# Altium footprint library ICs And Semiconductors SMD.PcbLib: 943 footprints (part 59 of 60)
Each footprint in its own frame and in the unit in brackets; x right, y up, seen from the top. Pads: shape width x height; smd on the part's side, far side on the other; paste and mask are expansions set on the pad; w line width, h text height; cw(c..) or ccw(c..) is an arc to the next point about the centre after c.
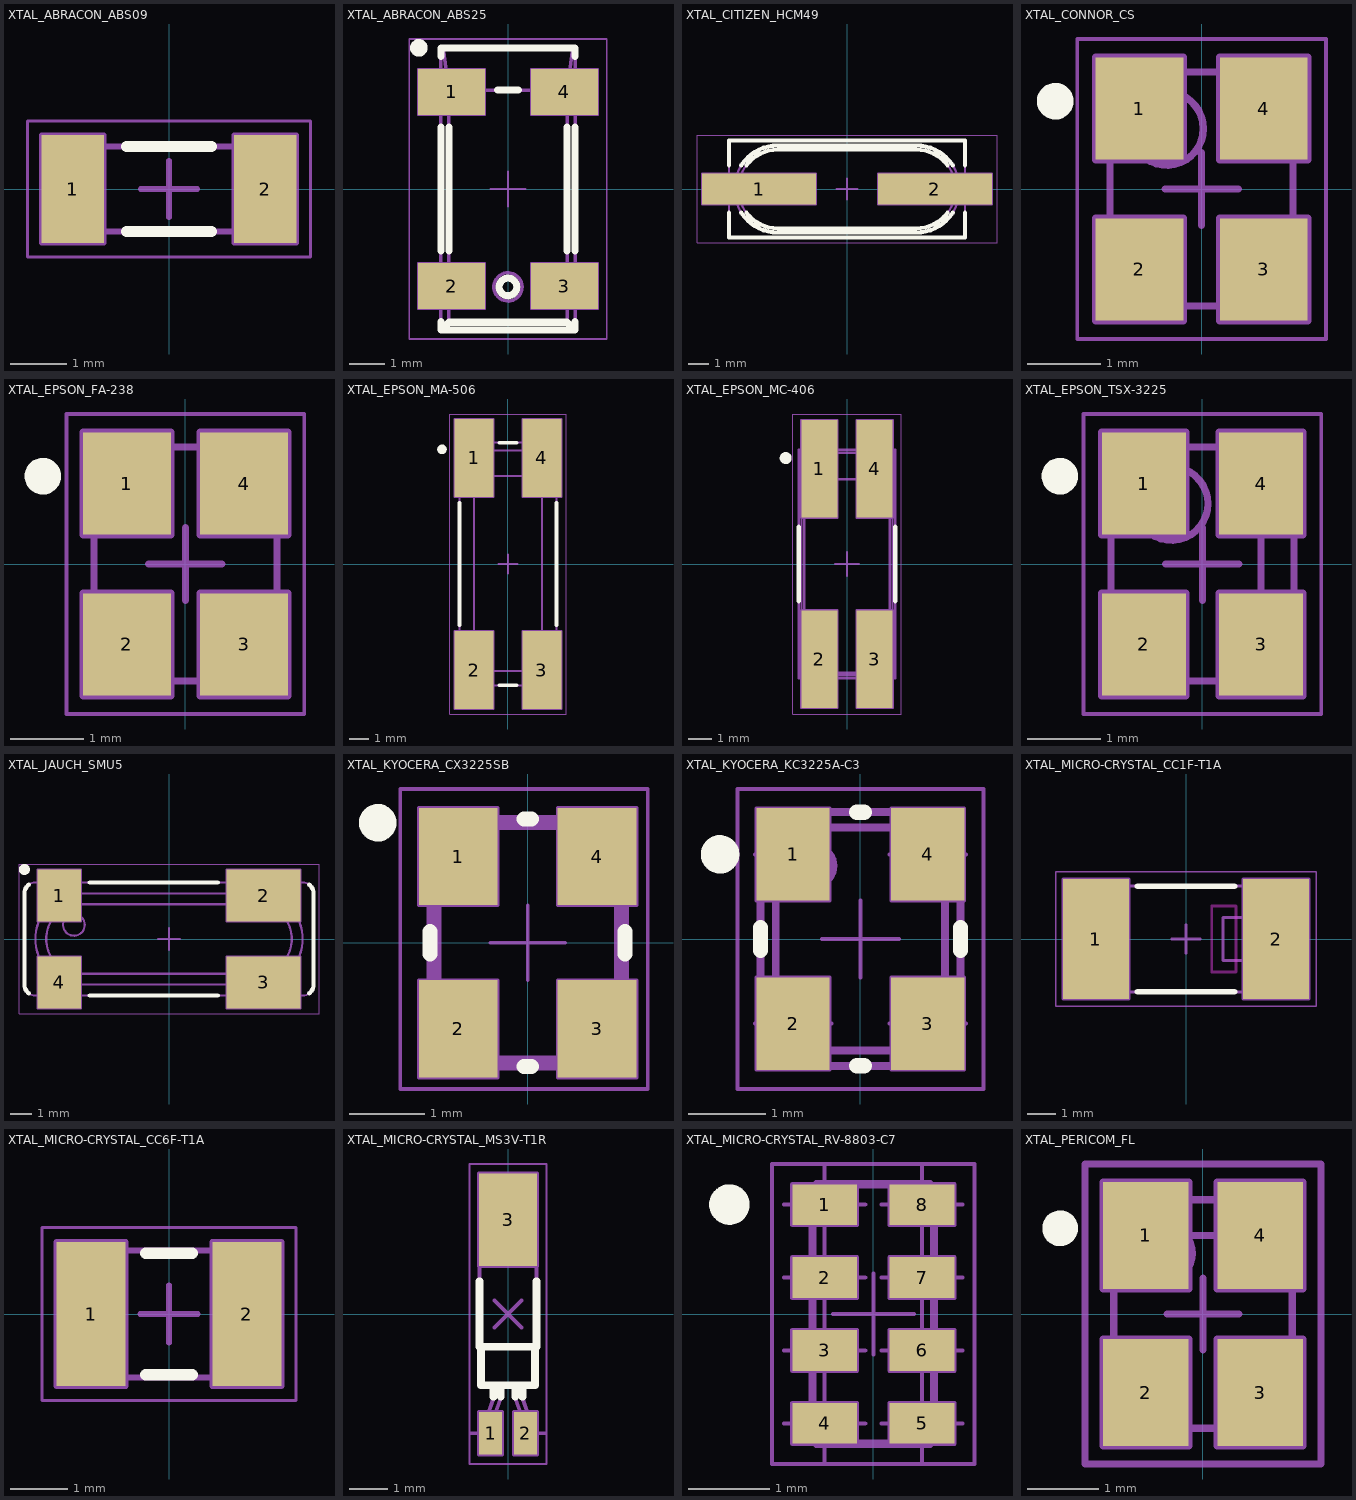
[diagram p58: the footprints below, top view; thin cyan lines are the x and y axes]

## XTAL_ABRACON_ABS09 [mm] "2 Pins, 4.1x1.5mm, SMD Low Profile Crystal, ABS09 Series"
height 0.9
pads (2):
  rect 1.1x1.9 smd: 1(-1.7,0) 2(1.7,0)
Top Overlay:
  lines w0.2: -0.75,-0.75 0.75,-0.75 ; -0.75,0.75 0.75,0.75
Mechanical 8:
  lines w0.1: -2.2,0 -1.7,0 ; -1.7,-0.5 -1.7,0 ; -1.7,0.5 -1.7,0 ; -1.2,0 -1.7,0 ; -0.5,0 0,0 ; 0,-0.5 0,0 ; 0,0.5 0,0 ; 0.5,0 0,0 ; 1.2,0 1.7,0 ; 1.7,-0.5 1.7,0 ; 1.7,0.5 1.7,0 ; 2.2,0 1.7,0 ; -2.25,-0.95 -2.25,0.95 -1.15,0.95 -1.15,-0.95 -2.25,-0.95 ; 1.15,-0.95 1.15,0.95 2.25,0.95 2.25,-0.95 1.15,-0.95
Mechanical 14:
  lines w0.1: -2.05,-0.6 cw(c-2.05,-0.75) -1.9,-0.75 1.9,-0.75 cw(c2.05,-0.75) 2.05,-0.6 2.05,0.6 cw(c2.05,0.75) 1.9,0.75 -1.9,0.75 cw(c-2.05,0.75) -2.05,0.6 -2.05,-0.6
Mechanical 15:
  lines w0.05: -2.5,-1.2 2.5,-1.2 2.5,1.2 -2.5,1.2 -2.5,-1.2
3D body "XTAL_ABRACON_ABS09.stp": height 0.9, standoff 0, extent -2.05,-0.75 2.05,0.75

## XTAL_ABRACON_ABS25 [mm] "4 Pins, 8mm L X 3.8mm W X 2.7mm H, SMD Crystal, ABS25 Serie"
height 2.7
pads (4):
  rect 1.9x1.3 smd: 1(-1.6,2.75) 2(-1.6,-2.75) 3(1.6,-2.75) 4(1.6,2.75)
Top Overlay:
  circle w0.25: c-2.525,4 r0.125
  circle w0.2: c0,-2.775 r0.25
  lines w0.2: -1.9,-3.75 -1.9,-4 ; -1.9,-1.75 -1.9,1.75 ; -1.9,3.75 -1.9,4 1.9,4 1.9,3.75 ; -1.675,-1.75 -1.675,1.75 ; -0.3,2.8 0.3,2.8 ; 1.675,-1.75 1.675,1.75 ; 1.9,-3.75 1.9,-4 ; 1.9,-1.75 1.9,1.75 ; -1.9,-4 1.9,-4 ; -1.9,-4 -1.675,-3.775 1.675,-3.775 1.9,-4
Mechanical 8:
  lines w0.05: -2.1,-2.75 -1.6,-2.75 ; -2.1,2.75 -1.6,2.75 ; -1.6,-3.25 -1.6,-2.75 ; -1.6,-2.25 -1.6,-2.75 ; -1.6,2.25 -1.6,2.75 ; -1.6,3.25 -1.6,2.75 ; -1.1,-2.75 -1.6,-2.75 ; -1.1,2.75 -1.6,2.75 ; -0.5,0 0,0 ; 0,-0.5 0,0 ; 0,0.5 0,0 ; 0.5,0 0,0 ; 1.1,-2.75 1.6,-2.75 ; 1.1,2.75 1.6,2.75 ; 1.6,-3.25 1.6,-2.75 ; 1.6,-2.25 1.6,-2.75 ; 1.6,2.25 1.6,2.75 ; 1.6,3.25 1.6,2.75 ; 2.1,-2.75 1.6,-2.75 ; 2.1,2.75 1.6,2.75 ; -2.55,-3.4 -2.55,-2.1 -0.65,-2.1 -0.65,-3.4 -2.55,-3.4 ; -2.55,2.1 -2.55,3.4 -0.65,3.4 -0.65,2.1 -2.55,2.1 ; 0.65,-3.4 0.65,-2.1 2.55,-2.1 2.55,-3.4 0.65,-3.4 ; 0.65,2.1 0.65,3.4 2.55,3.4 2.55,2.1 0.65,2.1
Mechanical 14:
  circle w0.1: c0,-2.775 r0.4
  lines w0.1: -1.9,-3 -2,-3 -2,-2.5 -1.9,-2.5 ; -1.9,2.5 -2,2.5 -2,3 -1.9,3 ; -1.836,4 -1.675,2.8 ; 1.836,4 1.675,2.8 ; 1.9,-3 2,-3 2,-2.5 1.9,-2.5 ; 1.9,2.5 2,2.5 2,3 1.9,3 ; -1.9,-4 1.9,-4 ; -1.9,-4 -1.9,4 1.9,4 1.9,-4 ; -1.9,-4 -1.675,-3.775 ; -1.675,-3.775 1.675,-3.775 ; -1.675,-3.775 -1.675,2.8 ; -1.675,2.8 1.675,2.8 ; 1.675,-3.775 1.9,-4 ; 1.675,-3.775 1.675,2.8
Mechanical 15:
  lines w0.05: -2.8,-4.25 -2.8,4.25 2.8,4.25 2.8,-4.25 -2.8,-4.25
3D body "XTAL_ABRACON_ABS25.stp": height 2.7, standoff 0, extent -2,-4 2,4

## XTAL_CITIZEN_HCM49 [mm] "CITIZEN HCM49 Case, SMD Cristal, Body 11.4 x 4.7mm"
height 4.3
pads (2):
  rect 5.5x1.5 smd: 1(-4.25,0) 2(4.25,0)
Top Overlay:
  lines w0.2: -5.7,-1.15 -5.7,-2.35 5.7,-2.35 5.7,-1.15 ; -5.7,1.15 -5.7,2.35 5.7,2.35 5.7,1.15 ; -5.108,-1.15 ccw(c-3.345,0) -3.345,-2.105 3.345,-2.105 ccw(c3.345,0) 5.108,-1.15 ; -5.108,1.15 cw(c-3.345,0) -3.345,2.105 3.345,2.105 cw(c3.345,0) 5.108,1.15 ; -4.864,-1.15 ccw(c-3.345,0) -3.345,-1.905 3.345,-1.905 ccw(c3.345,0) 4.864,-1.15 ; -4.864,1.15 cw(c-3.345,0) -3.345,1.905 3.345,1.905 cw(c3.345,0) 4.864,1.15
Mechanical 8:
  lines w0.1: -4.75,0 -4.25,0 ; -4.25,-0.5 -4.25,0 ; -4.25,0.5 -4.25,0 ; -3.75,0 -4.25,0 ; -0.5,0 0,0 ; 0,-0.5 0,0 ; 0,0.5 0,0 ; 0.5,0 0,0 ; 3.75,0 4.25,0 ; 4.25,-0.5 4.25,0 ; 4.25,0.5 4.25,0 ; 4.75,0 4.25,0 ; -7,-0.75 -1.5,-0.75 -1.5,0.75 -7,0.75 -7,-0.75 ; 1.5,-0.75 7,-0.75 7,0.75 1.5,0.75 1.5,-0.75
Mechanical 14:
  lines w0.1: -5.7,-2.35 5.7,-2.35 5.7,2.35 -5.7,2.35 -5.7,-2.35 ; -3.345,-2.105 cw(c-3.345,0) -3.345,2.105 3.345,2.105 cw(c3.345,0) 3.345,-2.105 -3.345,-2.105 ; -3.345,-1.905 cw(c-3.345,0) -3.345,1.905 3.345,1.905 cw(c3.345,0) 3.345,-1.905 -3.345,-1.905
Mechanical 15:
  lines w0.05: -7.25,-2.6 -7.25,2.6 7.25,2.6 7.25,-2.6 -7.25,-2.6
3D body "XTAL_CITIZEN_HCM49.stp": height 4.3, standoff 0, extent -6.002,-2.35 6.002,2.35

## XTAL_CONNOR_CS [mm] "4 Pins, 2.5x3.2mm, SMD Sealing Crystal, CS Serie"
height 0.8
pads (4):
  rect 1.2x1.4 smd: 1(-0.85,1.1) 2(-0.85,-1.1) 3(0.85,-1.1) 4(0.85,1.1)
Top Overlay:
  circle w0.25: c-2,1.2 r0.125
Mechanical 8:
  lines w0.1: -1.35,-1.1 -0.85,-1.1 ; -1.35,1.1 -0.85,1.1 ; -0.85,-1.6 -0.85,-1.1 ; -0.85,-0.6 -0.85,-1.1 ; -0.85,0.6 -0.85,1.1 ; -0.85,1.6 -0.85,1.1 ; -0.5,0 0,0 ; -0.35,-1.1 -0.85,-1.1 ; -0.35,1.1 -0.85,1.1 ; 0,-0.5 0,0 ; 0,0.5 0,0 ; 0.35,-1.1 0.85,-1.1 ; 0.35,1.1 0.85,1.1 ; 0.5,0 0,0 ; 0.85,-1.6 0.85,-1.1 ; 0.85,-0.6 0.85,-1.1 ; 0.85,0.6 0.85,1.1 ; 0.85,1.6 0.85,1.1 ; 1.35,-1.1 0.85,-1.1 ; 1.35,1.1 0.85,1.1 ; -1.45,-1.8 -0.25,-1.8 -0.25,-0.4 -1.45,-0.4 -1.45,-1.8 ; -1.45,0.4 -0.25,0.4 -0.25,1.8 -1.45,1.8 -1.45,0.4 ; 0.25,-1.8 1.45,-1.8 1.45,-0.4 0.25,-0.4 0.25,-1.8 ; 0.25,0.4 1.45,0.4 1.45,1.8 0.25,1.8 0.25,0.4
Mechanical 14:
  circle w0.1: c-0.475,0.825 r0.5
  lines w0.1: -1.25,-1.5 cw(c-1.25,-1.6) -1.15,-1.6 1.15,-1.6 cw(c1.25,-1.6) 1.25,-1.5 1.25,1.5 cw(c1.25,1.6) 1.15,1.6 -1.15,1.6 cw(c-1.25,1.6) -1.25,1.5 -1.25,-1.5
Mechanical 15:
  lines w0.05: -1.7,-2.05 1.7,-2.05 1.7,2.05 -1.7,2.05 -1.7,-2.05
3D body "XTAL_CONNOR_CS.stp": height 0.8, standoff 0, extent -1.25,-1.6 1.25,1.6

## XTAL_EPSON_FA-238 [mm] "Crystal FA-238 Series, Corner Concave; 4 pin, 2.50mm L X 3.2mm W X 0.7mm H"
height 0.7
pads (4):
  rect 1.2x1.4 smd: 1(-0.8,1.1) 2(-0.8,-1.1) 3(0.8,-1.1) 4(0.8,1.1)
Top Overlay:
  circle w0.25: c-1.95,1.2 r0.125
Mechanical 8:
  lines w0.1: -1.3,-1.1 -0.8,-1.1 ; -1.3,1.1 -0.8,1.1 ; -0.8,-1.6 -0.8,-1.1 ; -0.8,-0.6 -0.8,-1.1 ; -0.8,0.6 -0.8,1.1 ; -0.8,1.6 -0.8,1.1 ; -0.5,0 0,0 ; -0.3,-1.1 -0.8,-1.1 ; -0.3,1.1 -0.8,1.1 ; 0,-0.5 0,0 ; 0,0.5 0,0 ; 0.3,-1.1 0.8,-1.1 ; 0.3,1.1 0.8,1.1 ; 0.5,0 0,0 ; 0.8,-1.6 0.8,-1.1 ; 0.8,-0.6 0.8,-1.1 ; 0.8,0.6 0.8,1.1 ; 0.8,1.6 0.8,1.1 ; 1.3,-1.1 0.8,-1.1 ; 1.3,1.1 0.8,1.1 ; -1.4,-1.8 -0.2,-1.8 -0.2,-0.4 -1.4,-0.4 -1.4,-1.8 ; -1.4,0.4 -0.2,0.4 -0.2,1.8 -1.4,1.8 -1.4,0.4 ; 0.2,-1.8 1.4,-1.8 1.4,-0.4 0.2,-0.4 0.2,-1.8 ; 0.2,0.4 1.4,0.4 1.4,1.8 0.2,1.8 0.2,0.4
Mechanical 14:
  lines w0.1: -1.25,-1.5 cw(c-1.25,-1.6) -1.15,-1.6 1.15,-1.6 cw(c1.25,-1.6) 1.25,-1.5 1.25,1.5 cw(c1.25,1.6) 1.15,1.6 -1.15,1.6 cw(c-1.25,1.6) -1.25,1.5 -1.25,-1.5
Mechanical 15:
  lines w0.05: -1.625,-2.05 1.625,-2.05 1.625,2.05 -1.625,2.05 -1.625,-2.05
3D body "XTAL_EPSON_FA-238.stp": height 0.7, standoff 0, extent -1.25,-1.6 1.25,1.6

## XTAL_EPSON_MA-506 [mm] "EPSON Crystal; 12.7mm L X 5.08mm W X 4.6mm H"
height 4.6
pads (4):
  rect 2.05x4.1 smd: 1(-1.775,5.55) 2(-1.775,-5.55) 3(1.775,-5.55) 4(1.775,5.55)
Top Overlay:
  circle w0.25: c-3.455,6 r0.125
  lines w0.2: -2.54,-3.2 -2.54,3.2 ; -0.45,-6.35 0.45,-6.35 ; -0.45,6.35 0.45,6.35 ; 2.54,-3.2 2.54,3.2
Mechanical 8:
  lines w0.1: -2.275,-5.55 -1.775,-5.55 ; -2.275,5.55 -1.775,5.55 ; -1.775,-6.05 -1.775,-5.55 ; -1.775,-5.05 -1.775,-5.55 ; -1.775,5.05 -1.775,5.55 ; -1.775,6.05 -1.775,5.55 ; -1.275,-5.55 -1.775,-5.55 ; -1.275,5.55 -1.775,5.55 ; -0.5,0 0,0 ; 0,-0.5 0,0 ; 0,0.5 0,0 ; 0.5,0 0,0 ; 1.275,-5.55 1.775,-5.55 ; 1.275,5.55 1.775,5.55 ; 1.775,-6.05 1.775,-5.55 ; 1.775,-5.05 1.775,-5.55 ; 1.775,5.05 1.775,5.55 ; 1.775,6.05 1.775,5.55 ; 2.275,-5.55 1.775,-5.55 ; 2.275,5.55 1.775,5.55 ; -2.8,-7.6 -2.8,-3.5 -0.75,-3.5 -0.75,-7.6 -2.8,-7.6 ; -2.8,3.5 -2.8,7.6 -0.75,7.6 -0.75,3.5 -2.8,3.5 ; 0.75,-7.6 0.75,-3.5 2.8,-3.5 2.8,-7.6 0.75,-7.6 ; 0.75,3.5 0.75,7.6 2.8,7.6 2.8,3.5 0.75,3.5
Mechanical 14:
  lines w0.1: -2.54,-6.35 -1.79,-5.6 ; -2.54,-6.35 -2.54,6.35 ; -2.54,-6.35 2.54,-6.35 ; -2.54,6.35 -2.14,5.95 ; -2.54,6.35 2.54,6.35 ; -2.14,5.95 2.14,5.95 ; -2.14,5.95 -1.79,4.6 ; -1.79,-5.6 1.79,-5.6 ; -1.79,-5.6 -1.79,4.6 ; -1.79,4.6 1.79,4.6 ; 1.79,-5.6 2.54,-6.35 ; 1.79,-5.6 1.79,4.6 ; 1.79,4.6 2.14,5.95 ; 2.14,5.95 2.54,6.35 ; 2.54,-6.35 2.54,6.35
Mechanical 15:
  lines w0.05: -3.05,-7.85 -3.05,7.85 3.05,7.85 3.05,-7.85 -3.05,-7.85
3D body "XTAL_EPSON_MA-506.stp": height 4.6, standoff 0, extent -2.54,-6.73 2.54,6.73

## XTAL_EPSON_MC-406 [mm] "EPSON Crystal; 10.41mm L X 4.06mm W X 3.6mm H"
height 3.6
pads (4):
  rect 1.52x4.1 smd: 1(-1.16,4) 2(-1.16,-4) 3(1.16,-4) 4(1.16,4)
Top Overlay:
  circle w0.25: c-2.575,4.45 r0.125
  lines w0.2: -2.03,-1.55 -2.03,1.55 ; 2.03,-1.55 2.03,1.55
Mechanical 8:
  lines w0.1: -1.66,-4 -1.16,-4 ; -1.66,4 -1.16,4 ; -1.16,-4.5 -1.16,-4 ; -1.16,-3.5 -1.16,-4 ; -1.16,3.5 -1.16,4 ; -1.16,4.5 -1.16,4 ; -0.66,-4 -1.16,-4 ; -0.66,4 -1.16,4 ; -0.5,0 0,0 ; 0,-0.5 0,0 ; 0,0.5 0,0 ; 0.5,0 0,0 ; 0.66,-4 1.16,-4 ; 0.66,4 1.16,4 ; 1.16,-4.5 1.16,-4 ; 1.16,-3.5 1.16,-4 ; 1.16,3.5 1.16,4 ; 1.16,4.5 1.16,4 ; 1.66,-4 1.16,-4 ; 1.66,4 1.16,4 ; -1.92,-6.05 -1.92,-1.95 -0.4,-1.95 -0.4,-6.05 -1.92,-6.05 ; -1.92,1.95 -1.92,6.05 -0.4,6.05 -0.4,1.95 -1.92,1.95 ; 0.4,-6.05 0.4,-1.95 1.92,-1.95 1.92,-6.05 0.4,-6.05 ; 0.4,1.95 0.4,6.05 1.92,6.05 1.92,1.95 0.4,1.95
Mechanical 14:
  circle w0.1: c-1.025,2.575 r0.5
  lines w0.1: -1.4,-4.8 -1.4,-5.405 -0.89,-5.405 -0.89,-4.8 ; -0.89,4.8 -0.89,5.39 -1.4,5.39 -1.4,4.8 ; 0.89,-4.8 0.89,-5.405 1.4,-5.405 1.4,-4.8 ; 0.89,4.8 0.89,5.405 1.4,5.405 1.4,4.8 ; -2.03,-4.8 -1.79,-4.56 ; -2.03,-4.8 -2.03,4.8 ; -2.03,-4.8 2.03,-4.8 ; -2.03,4.8 -1.91,4.68 ; -2.03,4.8 2.03,4.8 2.03,-4.8 ; -2.03,4.8 -1.4,4.8 ; -2.03,4.8 -1.4,4.8 ; -1.91,4.68 1.91,4.68 ; -1.91,4.68 -1.91,-4.68 1.91,-4.68 1.91,4.68 ; -1.91,4.68 -1.79,3.56 ; -1.79,-4.56 -1.79,3.56 ; -1.79,-4.56 1.79,-4.56 ; -1.79,3.56 1.79,3.56 ; 1.79,-4.56 2.03,-4.8 ; 1.79,-4.56 1.79,3.56 ; 1.79,3.56 1.91,4.68
Mechanical 15:
  lines w0.05: -2.28,-6.3 2.28,-6.3 2.28,6.3 -2.28,6.3 -2.28,-6.3
3D body "XTAL_EPSON_MC-406.stp": height 3.6, standoff 0, extent -2.03,-5.405 2.03,5.405

## XTAL_EPSON_TSX-3225 [mm] "Crystal TSX-3225 Serie, Corner Concave; 4 pin, 2.50mm L X 3.2mm W X 0.6mm H"
height 0.6
pads (4):
  rect 1.15x1.4 smd: 1(-0.8,1.1) 2(-0.8,-1.1) 3(0.8,-1.1) 4(0.8,1.1)
Top Overlay:
  circle w0.25: c-1.95,1.2 r0.125
Mechanical 8:
  lines w0.1: -1.3,-1.1 -0.8,-1.1 ; -1.3,1.1 -0.8,1.1 ; -0.8,-1.6 -0.8,-1.1 ; -0.8,-0.6 -0.8,-1.1 ; -0.8,0.6 -0.8,1.1 ; -0.8,1.6 -0.8,1.1 ; -0.75,0.93 -0.75,1.43 ; -0.5,0 0,0 ; -0.3,-1.1 -0.8,-1.1 ; -0.3,1.1 -0.8,1.1 ; 0,-0.5 0,0 ; 0,0.5 0,0 ; 0.3,-1.1 0.8,-1.1 ; 0.3,1.1 0.8,1.1 ; 0.5,0 0,0 ; 0.8,-1.6 0.8,-1.1 ; 0.8,-0.6 0.8,-1.1 ; 0.8,0.6 0.8,1.1 ; 0.8,1.6 0.8,1.1 ; 1.3,-1.1 0.8,-1.1 ; 1.3,1.1 0.8,1.1 ; 0.8,-1.1 0.8,1.1 ; -1.375,-1.8 -1.375,-0.4 -0.225,-0.4 -0.225,-1.8 -1.375,-1.8 ; -1.375,0.4 -1.375,1.8 -0.225,1.8 -0.225,0.4 -1.375,0.4 ; 0.225,-1.8 0.225,-0.4 1.375,-0.4 1.375,-1.8 0.225,-1.8 ; 0.225,0.4 0.225,1.8 1.375,1.8 1.375,0.4 0.225,0.4
Mechanical 14:
  circle w0.1: c-0.425,0.825 r0.5
  lines w0.1: -1.25,-1.5 cw(c-1.25,-1.6) -1.15,-1.6 1.15,-1.6 cw(c1.25,-1.6) 1.25,-1.5 1.25,1.5 cw(c1.25,1.6) 1.15,1.6 -1.15,1.6 cw(c-1.25,1.6) -1.25,1.5 -1.25,-1.5
Mechanical 15:
  lines w0.05: -1.625,-2.05 -1.625,2.05 1.625,2.05 1.625,-2.05 -1.625,-2.05
3D body "XTAL_EPSON_TSX-3225.stp": height 0.6, standoff 0, extent -1.25,-1.6 1.25,1.6

## XTAL_JAUCH_SMU5 [mm] "JAUCH SMU5 Crystal; 13.1mm L X 5mm W X 5.1mm H"
height 5.1
pads (4):
  rect 2x2.4 smd: 1(-5.05,2) 4(-5.05,-2)
  rect 3.4x2.4 smd: 2(4.35,2) 3(4.35,-2)
Top Overlay:
  circle w0.25: c-6.65,3.2 r0.125
  lines w0.2: -6.45,-2.5 cw(c-6.15,-2.1) -6.65,-2.1 -6.65,2.1 cw(c-6.15,2.1) -6.45,2.5 ; -3.65,-2.6 2.25,-2.6 ; -3.65,2.6 2.25,2.6 ; 6.45,-2.5 ccw(c6.15,-2.1) 6.65,-2.1 6.65,2.1 ccw(c6.15,2.1) 6.45,2.5
Mechanical 8:
  lines w0.1: -5.55,-2 -5.05,-2 ; -5.55,2 -5.05,2 ; -5.05,-2.5 -5.05,-2 ; -5.05,-1.5 -5.05,-2 ; -5.05,1.5 -5.05,2 ; -5.05,2.5 -5.05,2 ; -4.55,-2 -5.05,-2 ; -4.55,2 -5.05,2 ; -0.5,0 0,0 ; 0,-0.5 0,0 ; 0,0.5 0,0 ; 0.5,0 0,0 ; 3.85,-2 4.35,-2 ; 3.85,2 4.35,2 ; 4.35,-2.5 4.35,-2 ; 4.35,-1.5 4.35,-2 ; 4.35,1.5 4.35,2 ; 4.35,2.5 4.35,2 ; 4.85,-2 4.35,-2 ; 4.85,2 4.35,2 ; -6.05,-3.2 -6.05,-0.8 -4.05,-0.8 -4.05,-3.2 -6.05,-3.2 ; -6.05,0.8 -6.05,3.2 -4.05,3.2 -4.05,0.8 -6.05,0.8 ; 2.65,-3.2 6.05,-3.2 6.05,-0.8 2.65,-0.8 2.65,-3.2 ; 2.65,0.8 6.05,0.8 6.05,3.2 2.65,3.2 2.65,0.8
Mechanical 14:
  circle w0.1: c-4.375,0.65 r0.5
  lines w0.1: -6.65,-2.1 ccw(c-6.15,-2.1) -6.15,-2.6 6.15,-2.6 ccw(c6.15,-2.1) 6.65,-2.1 6.65,2.1 ccw(c6.15,2.1) 6.15,2.6 -6.15,2.6 ccw(c-6.15,2.1) -6.65,2.1 -6.65,-2.1 ; -4.05,-2.1 cw(c-4.05,0) -4.05,2.1 4.05,2.1 cw(c4.05,0) 4.05,-2.1 -4.05,-2.1 ; -4.05,-1.6 cw(c-4.05,0) -4.05,1.6 4.05,1.6 cw(c4.05,0) 4.05,-1.6 -4.05,-1.6
Mechanical 15:
  lines w0.05: -6.9,-3.45 6.9,-3.45 6.9,3.45 -6.9,3.45 -6.9,-3.45
3D body "XTAL_JAUCH_SMU5.stp": height 5.1, standoff 0, extent -6.65,-2.6 6.65,2.6

## XTAL_KYOCERA_CX3225SB [mm] "SMD Crystal Kyocera, 4 Pin, 3.2mm L X 2.5mm W X 0.6mm H"
height 0.6
pads (4):
  rect 1.05x1.3 smd: 1(-0.925,1.15) 2(-0.925,-1.15) 3(0.925,-1.15) 4(0.925,1.15)
Top Overlay:
  circle w0.25: c-2,1.6 r0.125
  lines w0.2: -1.3,-0.15 -1.3,0.15 ; -0.05,-1.65 0.05,-1.65 ; -0.05,1.65 0.05,1.65 ; 1.3,-0.15 1.3,0.15
Mechanical 8:
  lines w0.05: -1.425,-1.15 -0.925,-1.15 ; -1.425,1.15 -0.925,1.15 ; -0.925,-1.65 -0.925,-1.15 ; -0.925,-0.65 -0.925,-1.15 ; -0.925,0.65 -0.925,1.15 ; -0.925,1.65 -0.925,1.15 ; -0.5,0 0,0 ; -0.425,-1.15 -0.925,-1.15 ; -0.425,1.15 -0.925,1.15 ; 0,-0.5 0,0 ; 0,0.5 0,0 ; 0.425,-1.15 0.925,-1.15 ; 0.425,1.15 0.925,1.15 ; 0.5,0 0,0 ; 0.925,-1.65 0.925,-1.15 ; 0.925,-0.65 0.925,-1.15 ; 0.925,0.65 0.925,1.15 ; 0.925,1.65 0.925,1.15 ; 1.425,-1.15 0.925,-1.15 ; 1.425,1.15 0.925,1.15 ; -1.45,-1.8 -0.4,-1.8 -0.4,-0.5 -1.45,-0.5 -1.45,-1.8 ; -1.45,0.5 -1.45,1.8 -0.4,1.8 -0.4,0.5 -1.45,0.5 ; 0.4,-1.8 1.45,-1.8 1.45,-0.5 0.4,-0.5 0.4,-1.8 ; 0.4,0.5 1.45,0.5 1.45,1.8 0.4,1.8 0.4,0.5
Mechanical 14:
  lines w0.1: -1.3,-1.45 cw(c-1.3,-1.65) -1.1,-1.65 1.1,-1.65 cw(c1.3,-1.65) 1.3,-1.45 1.3,1.45 cw(c1.3,1.65) 1.1,1.65 -1.1,1.65 cw(c-1.3,1.65) -1.3,1.45 -1.3,-1.45 ; -1.2,-1.15 ccw(c-0.8,-1.15) -0.8,-1.55 0.8,-1.55 ccw(c0.8,-1.15) 1.2,-1.15 1.2,1.15 ccw(c0.8,1.15) 0.8,1.55 -0.8,1.55 ccw(c-0.8,1.15) -1.2,1.15 -1.2,-1.15
Mechanical 15:
  lines w0.05: -1.7,-1.95 -1.7,2.05 1.6,2.05 1.6,-1.95 -1.7,-1.95
3D body "XTAL_KYOCERA_CX3225SB.stp": height 0.6, standoff 0, extent -1.3,-1.65 1.3,1.65

## XTAL_KYOCERA_KC3225A-C3 [mm] "SMD Crystal Kyocera, 4 Pin, 3.2mm L X 2.5mm W X 1mm H"
height 1
pads (4):
  rect 0.95x1.2 smd: 1(-0.875,1.1) 2(-0.875,-1.1) 3(0.875,-1.1) 4(0.875,1.1)
Top Overlay:
  circle w0.25: c-1.825,1.1 r0.125
  lines w0.2: -1.3,-0.15 -1.3,0.15 ; -0.05,-1.65 0.05,-1.65 ; -0.05,1.65 0.05,1.65 ; 1.3,-0.15 1.3,0.15
Mechanical 8:
  lines w0.05: -1.375,-1.1 -0.875,-1.1 ; -1.375,1.1 -0.875,1.1 ; -0.875,-1.6 -0.875,-1.1 ; -0.875,-0.6 -0.875,-1.1 ; -0.875,0.6 -0.875,1.1 ; -0.875,1.6 -0.875,1.1 ; -0.5,0 0,0 ; -0.375,-1.1 -0.875,-1.1 ; -0.375,1.1 -0.875,1.1 ; 0,-0.5 0,0 ; 0,0.5 0,0 ; 0.375,-1.1 0.875,-1.1 ; 0.375,1.1 0.875,1.1 ; 0.5,0 0,0 ; 0.875,-1.6 0.875,-1.1 ; 0.875,-0.6 0.875,-1.1 ; 0.875,0.6 0.875,1.1 ; 0.875,1.6 0.875,1.1 ; 1.375,-1.1 0.875,-1.1 ; 1.375,1.1 0.875,1.1 ; -1.35,-1.7 -0.4,-1.7 -0.4,-0.5 -1.35,-0.5 -1.35,-1.7 ; -1.35,0.5 -0.4,0.5 -0.4,1.7 -1.35,1.7 -1.35,0.5 ; 0.4,-1.7 1.35,-1.7 1.35,-0.5 0.4,-0.5 0.4,-1.7 ; 0.4,0.5 1.35,0.5 1.35,1.7 0.4,1.7 0.4,0.5
Mechanical 14:
  circle w0.1: c-0.6,0.95 r0.25
  lines w0.1: -1.3,-1.55 -1.3,-1.123 ccw(c-1.4,-0.95) -1.3,-0.777 -1.3,0.777 ccw(c-1.4,0.95) -1.3,1.123 -1.3,1.55 -0.835,1.55 ccw(c-0.835,1.75) -0.662,1.65 0.662,1.65 ccw(c0.835,1.75) 0.835,1.55 1.3,1.55 1.3,1.123 ccw(c1.4,0.95) 1.3,0.777 1.3,-0.777 ccw(c1.4,-0.95) 1.3,-1.123 1.3,-1.55 0.835,-1.55 ccw(c0.835,-1.75) 0.662,-1.65 -0.662,-1.65 ccw(c-0.835,-1.75) -0.835,-1.55 -1.3,-1.55 ; -1.1,-1.25 ccw(c-0.9,-1.25) -0.9,-1.45 0.9,-1.45 ccw(c0.9,-1.25) 1.1,-1.25 1.1,1.25 ccw(c0.9,1.25) 0.9,1.45 -0.9,1.45 ccw(c-0.9,1.25) -1.1,1.25 -1.1,-1.25
Mechanical 15:
  lines w0.05: -1.6,-1.95 1.6,-1.95 1.6,1.95 -1.6,1.95 -1.6,-1.95
3D body "XTAL_KYOCERA_KC3225A-C3.stp": height 1, standoff 0, extent -1.3,-1.65 1.3,1.65

## XTAL_MICRO-CRYSTAL_CC1F-T1A [mm] "2 Pins, 8x3.7mm, Inverted Mesa AT-Cut Crystal"
height 1.75
pads (2):
  rect 2.3x4.2 smd: 1(-3.15,0) 2(3.15,0)
Top Layer keep-out:
  lines w0.1: 0.9,-1.15 1.75,-1.15 1.75,1.15 0.9,1.15 0.9,-1.15
Top Overlay:
  lines w0.2: -1.7,-1.85 1.7,-1.85 ; -1.7,1.85 1.7,1.85
Mechanical 8:
  lines w0.1: -3.65,0 -3.15,0 ; -3.15,-0.5 -3.15,0 ; -3.15,0.5 -3.15,0 ; -2.65,0 -3.15,0 ; -0.5,0 0,0 ; 0,-0.5 0,0 ; 0,0.5 0,0 ; 0.5,0 0,0 ; 2,-0.75 1.3,-0.75 1.3,0.75 2,0.75 ; 2.65,0 3.15,0 ; 3.15,-0.5 3.15,0 ; 3.15,0.5 3.15,0 ; 3.65,0 3.15,0 ; -4.3,-2.1 -4.3,2.1 -2,2.1 -2,-2.1 -4.3,-2.1 ; 2,-2.1 2,2.1 4.3,2.1 4.3,-2.1 2,-2.1
Mechanical 14:
  lines w0.1: -3.75,-1.85 3.75,-1.85 cw(c4,-1.85) 4,-1.6 4,1.6 cw(c4,1.85) 3.75,1.85 -3.75,1.85 cw(c-4,1.85) -4,1.6 -4,-1.6 cw(c-4,-1.85) -3.75,-1.842
Mechanical 15:
  lines w0.05: -4.55,-2.35 -4.55,2.35 4.55,2.35 4.55,-2.35 -4.55,-2.35
3D body "XTAL_MICRO-CRYSTAL_CC1F-T1A.stp": height 1.75, standoff 0, extent -4,-1.85 4,1.85

## XTAL_MICRO-CRYSTAL_CC6F-T1A [mm] "DFN Case Style, Cristal, Body 3.5x2.5mm, CC6F-T1A Serie"
height 0.8
pads (2):
  rect 1.2x2.5 smd: 1(-1.35,0) 2(1.35,0)
Top Overlay:
  lines w0.2: -0.4,-1.05 0.4,-1.05 ; -0.4,1.05 0.4,1.05
Mechanical 8:
  lines w0.1: -1.85,0 -1.35,0 ; -1.35,-0.5 -1.35,0 ; -1.35,0.5 -1.35,0 ; -0.85,0 -1.35,0 ; -0.5,0 0,0 ; 0,-0.5 0,0 ; 0,0.5 0,0 ; 0.5,0 0,0 ; 0.85,0 1.35,0 ; 1.35,-0.5 1.35,0 ; 1.35,0.5 1.35,0 ; 1.85,0 1.35,0 ; -1.95,-1.25 -0.75,-1.25 -0.75,1.25 -1.95,1.25 -1.95,-1.25 ; 0.75,-1.25 1.95,-1.25 1.95,1.25 0.75,1.25 0.75,-1.25
Mechanical 14:
  lines w0.1: -1.75,-1.05 cw(c-1.75,-1.1) -1.7,-1.1 1.7,-1.1 cw(c1.75,-1.1) 1.75,-1.05 1.75,1.05 cw(c1.75,1.1) 1.7,1.1 -1.7,1.1 cw(c-1.75,1.1) -1.75,1.05 -1.75,-1.05
Mechanical 15:
  lines w0.05: -2.2,-1.5 -2.2,1.5 2.2,1.5 2.2,-1.5 -2.2,-1.5
3D body "XTAL_MICRO-CRYSTAL_CC6F-T1A.stp": height 0.8, standoff 0, extent -1.75,-1.1 1.75,1.1

## XTAL_MICRO-CRYSTAL_MS3V-T1R [mm] "2 Pins, 1.4 x 5.2 x 1.4mm , SMD Crystal, MS3V-T1R Serie"
height 1.48
pads (3):
  rect 0.6x1.1 smd: 1(-0.45,-3.1) 2(0.45,-3.1)
  rect 1.5x2.4 smd: 3(0,2.45)
Top Overlay:
  lines w0.2: -0.74,0.85 -0.74,-0.85 0.74,-0.85 0.74,0.85 ; -0.7,-0.85 -0.7,-1.85 0.7,-1.85 0.7,-0.85 ; -0.375,-2.15 -0.375,-1.85 ; -0.187,-2.15 -0.187,-1.85 ; 0.187,-2.15 0.187,-1.85 ; 0.375,-2.15 0.375,-1.85
Mechanical 8:
  lines w0.1: -0.95,-3.1 -0.45,-3.1 ; -0.5,2.45 0,2.45 ; -0.45,-3.6 -0.45,-3.1 ; -0.45,-2.6 -0.45,-3.1 ; -0.354,-0.354 0,0 ; -0.354,0.354 0,0 ; 0,1.95 0,2.45 ; 0,2.95 0,2.45 ; 0.354,-0.354 0,0 ; 0.354,0.354 0,0 ; 0.45,-3.6 0.45,-3.1 ; 0.45,-2.6 0.45,-3.1 ; 0.5,2.45 0,2.45 ; 0.95,-3.1 0.45,-3.1 ; -0.75,-3.65 -0.75,-2.55 -0.15,-2.55 -0.15,-3.65 -0.75,-3.65 ; -0.75,1.25 0.75,1.25 0.75,3.65 -0.75,3.65 -0.75,1.25 ; 0.15,-3.65 0.15,-2.55 0.75,-2.55 0.75,-3.65 0.15,-3.65
Mechanical 14:
  lines w0.1: -0.7,-0.85 -0.7,-1.85 0.7,-1.85 0.7,-0.85 ; -0.375,-1.85 -0.375,-2.194 -0.594,-2.803 -0.594,-3.35 -0.406,-3.35 -0.406,-2.803 -0.187,-2.194 -0.187,-1.85 ; 0.187,-1.85 0.187,-2.194 0.406,-2.803 0.406,-3.35 0.594,-3.35 0.594,-2.803 0.375,-2.194 0.375,-1.85 ; -0.74,-0.85 0.74,-0.85 0.74,3.35 -0.74,3.35 -0.74,-0.85
Mechanical 15:
  lines w0.05: -1,-3.9 1,-3.9 1,3.9 -1,3.9 -1,-3.9
3D body "XTAL_MICRO-CRYSTAL_MS3V-T1R.stp": height 1.48, standoff 0, extent -0.74,-3.35 0.74,3.35

## XTAL_MICRO-CRYSTAL_RV-8803-C7 [mm] "Crystal 8 Pins, 3.2 x 1.5 x 0.8mm, SMD Crystal, I2C"
height 0.8
pads (8):
  rect 0.8x0.5 smd: 1(-0.6,1.35) 2(-0.6,0.45) 3(-0.6,-0.45) 4(-0.6,-1.35) 5(0.6,-1.35) 6(0.6,-0.45) 7(0.6,0.45) 8(0.6,1.35)
Top Overlay:
  circle w0.25: c-1.775,1.35 r0.125
Mechanical 8:
  lines w0.05: -1.1,-1.35 -0.6,-1.35 ; -1.1,-0.45 -0.6,-0.45 ; -1.1,0.45 -0.6,0.45 ; -1.1,1.35 -0.6,1.35 ; -0.6,-1.85 -0.6,-1.35 ; -0.6,-0.95 -0.6,-0.45 ; -0.6,-0.85 -0.6,-1.35 ; -0.6,-0.05 -0.6,0.45 ; -0.6,0.05 -0.6,-0.45 ; -0.6,0.85 -0.6,1.35 ; -0.6,0.95 -0.6,0.45 ; -0.6,1.85 -0.6,1.35 ; -0.5,0 0,0 ; -0.1,-1.35 -0.6,-1.35 ; -0.1,-0.45 -0.6,-0.45 ; -0.1,0.45 -0.6,0.45 ; -0.1,1.35 -0.6,1.35 ; 0,-0.5 0,0 ; 0,0.5 0,0 ; 0.1,-1.35 0.6,-1.35 ; 0.1,-0.45 0.6,-0.45 ; 0.1,0.45 0.6,0.45 ; 0.1,1.35 0.6,1.35 ; 0.5,0 0,0 ; 0.6,-1.85 0.6,-1.35 ; 0.6,-0.95 0.6,-0.45 ; 0.6,-0.85 0.6,-1.35 ; 0.6,-0.05 0.6,0.45 ; 0.6,0.05 0.6,-0.45 ; 0.6,0.85 0.6,1.35 ; 0.6,0.95 0.6,0.45 ; 0.6,1.85 0.6,1.35 ; 1.1,-1.35 0.6,-1.35 ; 1.1,-0.45 0.6,-0.45 ; 1.1,0.45 0.6,0.45 ; 1.1,1.35 0.6,1.35 ; -1,-1.6 -1,-1.1 -0.2,-1.1 -0.2,-1.6 -1,-1.6 ; -1,-0.7 -1,-0.2 -0.2,-0.2 -0.2,-0.7 -1,-0.7 ; -1,0.2 -1,0.7 -0.2,0.7 -0.2,0.2 -1,0.2 ; -1,1.1 -1,1.6 -0.2,1.6 -0.2,1.1 -1,1.1 ; 0.2,-1.6 1,-1.6 1,-1.1 0.2,-1.1 0.2,-1.6 ; 0.2,-0.7 1,-0.7 1,-0.2 0.2,-0.2 0.2,-0.7 ; 0.2,0.2 1,0.2 1,0.7 0.2,0.7 0.2,0.2 ; 0.2,1.1 1,1.1 1,1.6 0.2,1.6 0.2,1.1
Mechanical 14:
  lines w0.1: -0.75,-1.55 cw(c-0.75,-1.6) -0.7,-1.6 0.7,-1.6 cw(c0.75,-1.6) 0.75,-1.55 0.75,1.55 cw(c0.75,1.6) 0.7,1.6 -0.7,1.6 cw(c-0.75,1.6) -0.75,1.55 -0.75,-1.55
Mechanical 15:
  lines w0.05: -1.25,-1.85 1.25,-1.85 1.25,1.85 -1.25,1.85 -1.25,-1.85
3D body "XTAL_MICRO-CRYSTAL_RV-8803-C7.stp": height 0.8, standoff 0, extent -0.75,-1.6 0.75,1.6

## XTAL_PERICOM_FL [mm] "4 Pins, 2.5x3.2mm, SMD Sealing Crystal, PERICOM FL Series"
height 0.75
pads (4):
  rect 1.2x1.5 smd: 1(-0.8,1.1) 2(-0.8,-1.1) 3(0.8,-1.1) 4(0.8,1.1)
Top Overlay:
  circle w0.25: c-2,1.2 r0.125
Mechanical 8:
  lines w0.1: -1.3,-1.1 -0.8,-1.1 ; -1.3,1.1 -0.8,1.1 ; -0.8,-1.6 -0.8,-1.1 ; -0.8,-0.6 -0.8,-1.1 ; -0.8,0.6 -0.8,1.1 ; -0.8,1.6 -0.8,1.1 ; -0.5,0 0,0 ; -0.3,-1.1 -0.8,-1.1 ; -0.3,1.1 -0.8,1.1 ; 0,-0.5 0,0 ; 0,0.5 0,0 ; 0.3,-1.1 0.8,-1.1 ; 0.3,1.1 0.8,1.1 ; 0.5,0 0,0 ; 0.8,-1.6 0.8,-1.1 ; 0.8,-0.6 0.8,-1.1 ; 0.8,0.6 0.8,1.1 ; 0.8,1.6 0.8,1.1 ; 1.3,-1.1 0.8,-1.1 ; 1.3,1.1 0.8,1.1 ; -0.8,1.1 0.8,1.1 ; -1.4,-1.85 -1.4,-0.35 -0.2,-0.35 -0.2,-1.85 -1.4,-1.85 ; -1.4,0.35 -1.4,1.85 -0.2,1.85 -0.2,0.35 -1.4,0.35 ; 0.2,-1.85 0.2,-0.35 1.4,-0.35 1.4,-1.85 0.2,-1.85 ; 0.2,0.35 0.2,1.85 1.4,1.85 1.4,0.35 0.2,0.35
Mechanical 14:
  circle w0.1: c-0.55,0.85 r0.4
  lines w0.1: -1.25,-1.5 cw(c-1.25,-1.6) -1.15,-1.6 1.15,-1.6 cw(c1.25,-1.6) 1.25,-1.5 1.25,1.5 cw(c1.25,1.6) 1.15,1.6 -1.15,1.6 cw(c-1.25,1.6) -1.25,1.5 -1.25,-1.5
Mechanical 15:
  lines w0.1: -1.65,-2.1 -1.65,2.1 1.65,2.1 1.65,-2.1 -1.65,-2.1
3D body "XTAL_PERICOM_FL.stp": height 0.75, standoff 0, extent -1.25,-1.6 1.25,1.6